# Altium footprint library Header.PcbLib: 297 footprints (part 19 of 23)
Each footprint in its own frame and in the unit in brackets; x right, y up, seen from the top. Pads: shape width x height; smd on the part's side, far side on the other; paste and mask are expansions set on the pad; w line width, h text height; cw(c..) or ccw(c..) is an arc to the next point about the centre after c.
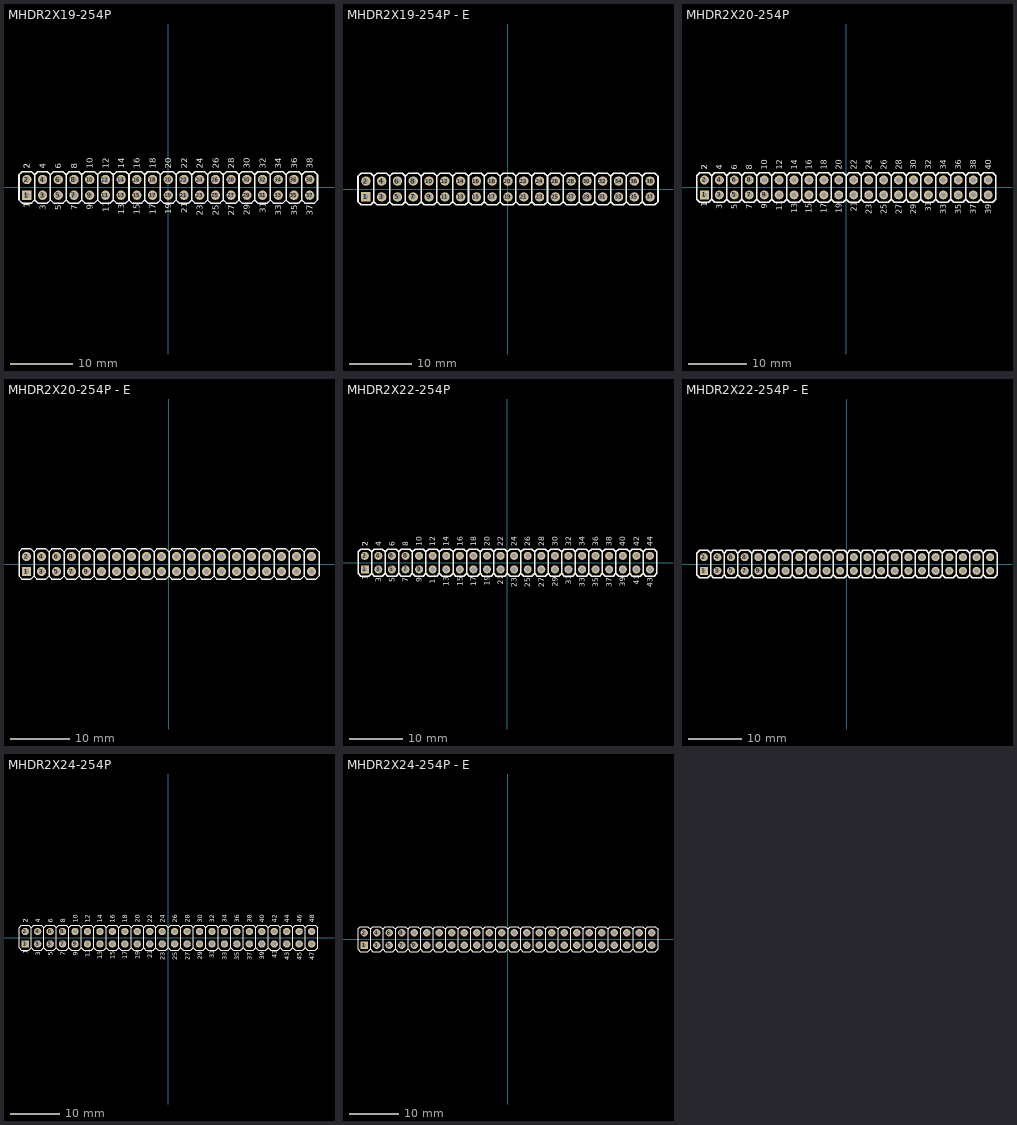
[diagram p18: the footprints below, top view; thin cyan lines are the x and y axes]

## MHDR2X19-254P [mm] "Male Header 2X19 with 2.54 mm Pitch"
pads (38):
  rect 1.5x1.5 hole 0.9: 1(-22.86,-1.27)
  round 1.5 hole 0.9: 2(-22.86,1.27) 3(-20.32,-1.27) 4(-20.32,1.27) 5(-17.78,-1.27) 6(-17.78,1.27) 7(-15.24,-1.27) 8(-15.24,1.27) 9(-12.7,-1.27) 10(-12.7,1.27) 11(-10.16,-1.27) 12(-10.16,1.27) 13(-7.62,-1.27) 14(-7.62,1.27) 15(-5.08,-1.27) 16(-5.08,1.27) 17(-2.54,-1.27) 18(-2.54,1.27) 19(0,-1.27) 20(0,1.27) 21(2.54,-1.27) 22(2.54,1.27) 23(5.08,-1.27) 24(5.08,1.27) 25(7.62,-1.27) 26(7.62,1.27) 27(10.16,-1.27) 28(10.16,1.27) 29(12.7,-1.27) 30(12.7,1.27) 31(15.24,-1.27) 32(15.24,1.27) 33(17.78,-1.27) 34(17.78,1.27) 35(20.32,-1.27) 36(20.32,1.27) 37(22.86,-1.27) 38(22.86,1.27)
Top Overlay:
  lines w0.254: -21.59,-2.032 -21.083,-2.538 -19.558,-2.538 -19.05,-2.03 -19.05,2.034 -18.542,2.542 -17.019,2.542 -16.51,2.032 ; -21.59,2.032 -22.099,2.542 -23.622,2.542 -24.13,2.034 -24.13,-2.032 -23.623,-2.538 -22.098,-2.538 -21.59,-2.03 -21.59,2.034 -21.082,2.542 -19.559,2.542 -19.05,2.032 ; -19.05,-2.032 -18.543,-2.538 -17.018,-2.538 -16.51,-2.03 -16.51,2.034 -16.002,2.542 -14.479,2.542 -13.97,2.032 ; -16.51,-2.032 -16.003,-2.538 -14.478,-2.538 -13.97,-2.03 -13.97,2.034 -13.462,2.542 -11.939,2.542 -11.43,2.032 ; -13.97,-2.032 -13.463,-2.538 -11.938,-2.538 -11.43,-2.03 -11.43,2.034 -10.922,2.542 -9.399,2.542 -8.89,2.032 ; -11.43,-2.032 -10.923,-2.538 -9.398,-2.538 -8.89,-2.03 -8.89,2.034 -8.382,2.542 -6.859,2.542 -6.35,2.032 ; -8.89,-2.032 -8.383,-2.538 -6.858,-2.538 -6.35,-2.03 -6.35,2.034 -5.842,2.542 -4.319,2.542 -3.81,2.032 ; -6.35,-2.032 -5.843,-2.538 -4.318,-2.538 -3.81,-2.03 -3.81,2.034 -3.302,2.542 -1.779,2.542 -1.27,2.032 ; -3.81,-2.032 -3.303,-2.538 -1.778,-2.538 -1.27,-2.03 -1.27,2.034 -0.762,2.542 0.761,2.542 1.27,2.032 ; -1.27,-2.032 -0.763,-2.538 0.762,-2.538 1.27,-2.03 1.27,2.034 1.778,2.542 3.301,2.542 3.81,2.032 ; 1.27,-2.032 1.777,-2.538 3.302,-2.538 3.81,-2.03 3.81,2.034 4.318,2.542 5.841,2.542 6.35,2.032 ; 3.81,-2.032 4.317,-2.538 5.842,-2.538 6.35,-2.03 6.35,2.034 6.858,2.542 8.381,2.542 8.89,2.032 ; 6.35,-2.032 6.857,-2.538 8.382,-2.538 8.89,-2.03 8.89,2.034 9.398,2.542 10.921,2.542 11.43,2.032 ; 8.89,-2.032 9.397,-2.538 10.922,-2.538 11.43,-2.03 11.43,2.034 11.938,2.542 13.461,2.542 13.97,2.032 ; 11.43,-2.032 11.937,-2.538 13.462,-2.538 13.97,-2.03 13.97,2.034 14.478,2.542 16.001,2.542 16.51,2.032 ; 13.97,-2.032 14.477,-2.538 16.002,-2.538 16.51,-2.03 16.51,2.034 17.018,2.542 18.541,2.542 19.05,2.032 ; 16.51,-2.032 17.017,-2.538 18.542,-2.538 19.05,-2.03 19.05,2.034 19.558,2.542 21.081,2.542 21.59,2.032 ; 19.05,-2.032 19.557,-2.538 21.082,-2.538 21.59,-2.03 21.59,2.034 22.098,2.542 23.621,2.542 24.13,2.032 ; 21.59,-2.032 22.097,-2.538 23.622,-2.538 24.13,-2.03 24.13,2.034
  text "1" at -22.352,-3.253 h1
  text "2" at -22.352,3.048 h1
  text "2" at -22.352,3.048 h1
  text "1" at -22.352,-3.253 h1
  text "4" at -19.812,3.048 h1
  text "3" at -19.812,-3.682 h1
  text "6" at -17.272,3.048 h1
  text "5" at -17.272,-3.682 h1
  text "8" at -14.732,3.048 h1
  text "7" at -14.732,-3.682 h1
  text "10" at -12.192,3.048 h1
  text "9" at -12.192,-3.634 h1
  text "12" at -9.652,3.048 h1
  text "11" at -9.652,-3.986 h1
  text "14" at -7.112,3.048 h1
  text "13" at -7.112,-4.415 h1
  text "16" at -4.572,3.048 h1
  text "15" at -4.572,-4.415 h1
  text "18" at -2.032,3.048 h1
  text "17" at -2.032,-4.415 h1
  text "20" at 0.508,3.048 h1
  text "19" at 0.508,-4.367 h1
  text "22" at 3.048,3.048 h1
  text "21" at 3.048,-4.144 h1
  text "24" at 5.588,3.048 h1
  text "23" at 5.588,-4.572 h1
  text "26" at 8.128,3.048 h1
  text "25" at 8.128,-4.572 h1
  text "28" at 10.668,3.048 h1
  text "27" at 10.668,-4.572 h1
  text "30" at 13.208,3.048 h1
  text "29" at 13.208,-4.524 h1
  text "32" at 15.748,3.048 h1
  text "31" at 15.748,-4.144 h1
  text "34" at 18.288,3.048 h1
  text "33" at 18.288,-4.572 h1
  text "36" at 20.828,3.048 h1
  text "35" at 20.828,-4.572 h1
  text "38" at 23.368,3.048 h1
  text "37" at 23.368,-4.572 h1
3D body "PIN.STEP": height 8.43, standoff -2.49, extent 21.59,0 24.13,2.54
3D body "PIN.STEP": height 8.43, standoff -2.49, extent 21.59,-2.54 24.13,0
3D body "PIN.STEP": height 8.43, standoff -2.49, extent -24.13,-2.54 -21.59,0
3D body "PIN_mid.STEP": height 8.43, standoff -2.49, extent -19.05,0 -16.51,2.54
3D body "PIN_mid.STEP": height 8.43, standoff -2.49, extent -16.51,0 -13.97,2.54
3D body "PIN_mid.STEP": height 8.43, standoff -2.49, extent -13.97,0 -11.43,2.54
3D body "PIN_mid.STEP": height 8.43, standoff -2.49, extent -11.43,0 -8.89,2.54
3D body "PIN_mid.STEP": height 8.43, standoff -2.49, extent -8.89,0 -6.35,2.54
3D body "PIN_mid.STEP": height 8.43, standoff -2.49, extent -6.35,0 -3.81,2.54
3D body "PIN_mid.STEP": height 8.43, standoff -2.49, extent -3.81,0 -1.27,2.54
3D body "PIN_mid.STEP": height 8.43, standoff -2.49, extent -1.27,0 1.27,2.54
3D body "PIN_mid.STEP": height 8.43, standoff -2.49, extent 1.27,0 3.81,2.54
3D body "PIN_mid.STEP": height 8.43, standoff -2.49, extent 3.81,0 6.35,2.54
3D body "PIN_mid.STEP": height 8.43, standoff -2.49, extent 6.35,0 8.89,2.54
3D body "PIN_mid.STEP": height 8.43, standoff -2.49, extent 8.89,0 11.43,2.54
3D body "PIN_mid.STEP": height 8.43, standoff -2.49, extent 11.43,0 13.97,2.54
3D body "PIN_mid.STEP": height 8.43, standoff -2.49, extent 13.97,0 16.51,2.54
3D body "PIN_mid.STEP": height 8.43, standoff -2.49, extent 16.51,0 19.05,2.54
3D body "PIN_mid.STEP": height 8.43, standoff -2.49, extent 19.05,0 21.59,2.54
3D body "PIN_mid.STEP": height 8.43, standoff -2.49, extent -21.59,0 -19.05,2.54
3D body "PIN_mid.STEP": height 8.43, standoff -2.49, extent -21.59,-2.54 -19.05,0
3D body "PIN_mid.STEP": height 8.43, standoff -2.49, extent -19.05,-2.54 -16.51,0
3D body "PIN_mid.STEP": height 8.43, standoff -2.49, extent -16.51,-2.54 -13.97,0
3D body "PIN_mid.STEP": height 8.43, standoff -2.49, extent -13.97,-2.54 -11.43,0
3D body "PIN_mid.STEP": height 8.43, standoff -2.49, extent -11.43,-2.54 -8.89,0
3D body "PIN_mid.STEP": height 8.43, standoff -2.49, extent -8.89,-2.54 -6.35,0
3D body "PIN_mid.STEP": height 8.43, standoff -2.49, extent -6.35,-2.54 -3.81,0
3D body "PIN_mid.STEP": height 8.43, standoff -2.49, extent -3.81,-2.54 -1.27,0
3D body "PIN_mid.STEP": height 8.43, standoff -2.49, extent -1.27,-2.54 1.27,0
3D body "PIN_mid.STEP": height 8.43, standoff -2.49, extent 1.27,-2.54 3.81,0
3D body "PIN_mid.STEP": height 8.43, standoff -2.49, extent 3.81,-2.54 6.35,0
3D body "PIN_mid.STEP": height 8.43, standoff -2.49, extent 6.35,-2.54 8.89,0
3D body "PIN_mid.STEP": height 8.43, standoff -2.49, extent 8.89,-2.54 11.43,0
3D body "PIN_mid.STEP": height 8.43, standoff -2.49, extent 11.43,-2.54 13.97,0
3D body "PIN_mid.STEP": height 8.43, standoff -2.49, extent 13.97,-2.54 16.51,0
3D body "PIN_mid.STEP": height 8.43, standoff -2.49, extent 16.51,-2.54 19.05,0
3D body "PIN_mid.STEP": height 8.43, standoff -2.49, extent 19.05,-2.54 21.59,0
3D body "PIN.STEP": height 8.43, standoff -2.49, extent -24.13,0 -21.59,2.54

## MHDR2X19-254P - E [mm] "Male Header 2X19 with 2.54 mm Pitch"
pads (38):
  rect 1.5x1.5 hole 0.9: 1(-22.86,-1.27)
  round 1.5 hole 0.9: 2(-22.86,1.27) 3(-20.32,-1.27) 4(-20.32,1.27) 5(-17.78,-1.27) 6(-17.78,1.27) 7(-15.24,-1.27) 8(-15.24,1.27) 9(-12.7,-1.27) 10(-12.7,1.27) 11(-10.16,-1.27) 12(-10.16,1.27) 13(-7.62,-1.27) 14(-7.62,1.27) 15(-5.08,-1.27) 16(-5.08,1.27) 17(-2.54,-1.27) 18(-2.54,1.27) 19(0,-1.27) 20(0,1.27) 21(2.54,-1.27) 22(2.54,1.27) 23(5.08,-1.27) 24(5.08,1.27) 25(7.62,-1.27) 26(7.62,1.27) 27(10.16,-1.27) 28(10.16,1.27) 29(12.7,-1.27) 30(12.7,1.27) 31(15.24,-1.27) 32(15.24,1.27) 33(17.78,-1.27) 34(17.78,1.27) 35(20.32,-1.27) 36(20.32,1.27) 37(22.86,-1.27) 38(22.86,1.27)
Top Overlay:
  lines w0.254: -21.59,-2.032 -21.083,-2.538 -19.558,-2.538 -19.05,-2.03 -19.05,2.034 -18.542,2.542 -17.019,2.542 -16.51,2.032 ; -21.59,2.032 -22.099,2.542 -23.622,2.542 -24.13,2.034 -24.13,-2.032 -23.623,-2.538 -22.098,-2.538 -21.59,-2.03 -21.59,2.034 -21.082,2.542 -19.559,2.542 -19.05,2.032 ; -19.05,-2.032 -18.543,-2.538 -17.018,-2.538 -16.51,-2.03 -16.51,2.034 -16.002,2.542 -14.479,2.542 -13.97,2.032 ; -16.51,-2.032 -16.003,-2.538 -14.478,-2.538 -13.97,-2.03 -13.97,2.034 -13.462,2.542 -11.939,2.542 -11.43,2.032 ; -13.97,-2.032 -13.463,-2.538 -11.938,-2.538 -11.43,-2.03 -11.43,2.034 -10.922,2.542 -9.399,2.542 -8.89,2.032 ; -11.43,-2.032 -10.923,-2.538 -9.398,-2.538 -8.89,-2.03 -8.89,2.034 -8.382,2.542 -6.859,2.542 -6.35,2.032 ; -8.89,-2.032 -8.383,-2.538 -6.858,-2.538 -6.35,-2.03 -6.35,2.034 -5.842,2.542 -4.319,2.542 -3.81,2.032 ; -6.35,-2.032 -5.843,-2.538 -4.318,-2.538 -3.81,-2.03 -3.81,2.034 -3.302,2.542 -1.779,2.542 -1.27,2.032 ; -3.81,-2.032 -3.303,-2.538 -1.778,-2.538 -1.27,-2.03 -1.27,2.034 -0.762,2.542 0.761,2.542 1.27,2.032 ; -1.27,-2.032 -0.763,-2.538 0.762,-2.538 1.27,-2.03 1.27,2.034 1.778,2.542 3.301,2.542 3.81,2.032 ; 1.27,-2.032 1.777,-2.538 3.302,-2.538 3.81,-2.03 3.81,2.034 4.318,2.542 5.841,2.542 6.35,2.032 ; 3.81,-2.032 4.317,-2.538 5.842,-2.538 6.35,-2.03 6.35,2.034 6.858,2.542 8.381,2.542 8.89,2.032 ; 6.35,-2.032 6.857,-2.538 8.382,-2.538 8.89,-2.03 8.89,2.034 9.398,2.542 10.921,2.542 11.43,2.032 ; 8.89,-2.032 9.397,-2.538 10.922,-2.538 11.43,-2.03 11.43,2.034 11.938,2.542 13.461,2.542 13.97,2.032 ; 11.43,-2.032 11.937,-2.538 13.462,-2.538 13.97,-2.03 13.97,2.034 14.478,2.542 16.001,2.542 16.51,2.032 ; 13.97,-2.032 14.477,-2.538 16.002,-2.538 16.51,-2.03 16.51,2.034 17.018,2.542 18.541,2.542 19.05,2.032 ; 16.51,-2.032 17.017,-2.538 18.542,-2.538 19.05,-2.03 19.05,2.034 19.558,2.542 21.081,2.542 21.59,2.032 ; 19.05,-2.032 19.557,-2.538 21.082,-2.538 21.59,-2.03 21.59,2.034 22.098,2.542 23.621,2.542 24.13,2.032 ; 21.59,-2.032 22.097,-2.538 23.622,-2.538 24.13,-2.03 24.13,2.034
3D body "PIN_mid.STEP": height 8.43, standoff -2.49, extent -19.05,0 -16.51,2.54
3D body "PIN_mid.STEP": height 8.43, standoff -2.49, extent -16.51,0 -13.97,2.54
3D body "PIN_mid.STEP": height 8.43, standoff -2.49, extent -13.97,0 -11.43,2.54
3D body "PIN_mid.STEP": height 8.43, standoff -2.49, extent -11.43,0 -8.89,2.54
3D body "PIN_mid.STEP": height 8.43, standoff -2.49, extent -8.89,0 -6.35,2.54
3D body "PIN_mid.STEP": height 8.43, standoff -2.49, extent -6.35,0 -3.81,2.54
3D body "PIN_mid.STEP": height 8.43, standoff -2.49, extent -3.81,0 -1.27,2.54
3D body "PIN_mid.STEP": height 8.43, standoff -2.49, extent -1.27,0 1.27,2.54
3D body "PIN_mid.STEP": height 8.43, standoff -2.49, extent 1.27,0 3.81,2.54
3D body "PIN_mid.STEP": height 8.43, standoff -2.49, extent 3.81,0 6.35,2.54
3D body "PIN_mid.STEP": height 8.43, standoff -2.49, extent 6.35,0 8.89,2.54
3D body "PIN_mid.STEP": height 8.43, standoff -2.49, extent 8.89,0 11.43,2.54
3D body "PIN_mid.STEP": height 8.43, standoff -2.49, extent 11.43,0 13.97,2.54
3D body "PIN_mid.STEP": height 8.43, standoff -2.49, extent 13.97,0 16.51,2.54
3D body "PIN_mid.STEP": height 8.43, standoff -2.49, extent 16.51,0 19.05,2.54
3D body "PIN_mid.STEP": height 8.43, standoff -2.49, extent 19.05,0 21.59,2.54
3D body "PIN_mid.STEP": height 8.43, standoff -2.49, extent -21.59,0 -19.05,2.54
3D body "PIN_mid.STEP": height 8.43, standoff -2.49, extent -21.59,-2.54 -19.05,0
3D body "PIN_mid.STEP": height 8.43, standoff -2.49, extent -19.05,-2.54 -16.51,0
3D body "PIN_mid.STEP": height 8.43, standoff -2.49, extent -16.51,-2.54 -13.97,0
3D body "PIN_mid.STEP": height 8.43, standoff -2.49, extent -13.97,-2.54 -11.43,0
3D body "PIN_mid.STEP": height 8.43, standoff -2.49, extent -11.43,-2.54 -8.89,0
3D body "PIN_mid.STEP": height 8.43, standoff -2.49, extent -8.89,-2.54 -6.35,0
3D body "PIN_mid.STEP": height 8.43, standoff -2.49, extent -6.35,-2.54 -3.81,0
3D body "PIN_mid.STEP": height 8.43, standoff -2.49, extent -3.81,-2.54 -1.27,0
3D body "PIN_mid.STEP": height 8.43, standoff -2.49, extent -1.27,-2.54 1.27,0
3D body "PIN_mid.STEP": height 8.43, standoff -2.49, extent 1.27,-2.54 3.81,0
3D body "PIN_mid.STEP": height 8.43, standoff -2.49, extent 3.81,-2.54 6.35,0
3D body "PIN_mid.STEP": height 8.43, standoff -2.49, extent 6.35,-2.54 8.89,0
3D body "PIN_mid.STEP": height 8.43, standoff -2.49, extent 8.89,-2.54 11.43,0
3D body "PIN_mid.STEP": height 8.43, standoff -2.49, extent 11.43,-2.54 13.97,0
3D body "PIN_mid.STEP": height 8.43, standoff -2.49, extent 13.97,-2.54 16.51,0
3D body "PIN_mid.STEP": height 8.43, standoff -2.49, extent 16.51,-2.54 19.05,0
3D body "PIN_mid.STEP": height 8.43, standoff -2.49, extent 19.05,-2.54 21.59,0
3D body "PIN.STEP": height 8.43, standoff -2.49, extent -24.13,0 -21.59,2.54
3D body "PIN.STEP": height 8.43, standoff -2.49, extent 21.59,0 24.13,2.54
3D body "PIN.STEP": height 8.43, standoff -2.49, extent 21.59,-2.54 24.13,0
3D body "PIN.STEP": height 8.43, standoff -2.49, extent -24.13,-2.54 -21.59,0

## MHDR2X20-254P [mm] "Male Header 2X20 with 2.54 mm Pitch"
pads (40):
  rect 1.5x1.5 hole 0.9: 1(-24.13,-1.27)
  round 1.5 hole 0.9: 2(-24.13,1.27) 3(-21.59,-1.27) 4(-21.59,1.27) 5(-19.05,-1.27) 6(-19.05,1.27) 7(-16.51,-1.27) 8(-16.51,1.27) 9(-13.97,-1.27) 10(-13.97,1.27) 11(-11.43,-1.27) 12(-11.43,1.27) 13(-8.89,-1.27) 14(-8.89,1.27) 15(-6.35,-1.27) 16(-6.35,1.27) 17(-3.81,-1.27) 18(-3.81,1.27) 19(-1.27,-1.27) 20(-1.27,1.27) 21(1.27,-1.27) 22(1.27,1.27) 23(3.81,-1.27) 24(3.81,1.27) 25(6.35,-1.27) 26(6.35,1.27) 27(8.89,-1.27) 28(8.89,1.27) 29(11.43,-1.27) 30(11.43,1.27) 31(13.97,-1.27) 32(13.97,1.27) 33(16.51,-1.27) 34(16.51,1.27) 35(19.05,-1.27) 36(19.05,1.27) 37(21.59,-1.27) 38(21.59,1.27) 39(24.13,-1.27) 40(24.13,1.27)
Top Overlay:
  lines w0.254: -22.86,-2.032 -22.353,-2.538 -20.828,-2.538 -20.32,-2.03 -20.32,2.034 -19.812,2.542 -18.289,2.542 -17.78,2.032 ; -22.86,2.032 -23.369,2.542 -24.892,2.542 -25.4,2.034 -25.4,-2.032 -24.893,-2.538 -23.368,-2.538 -22.86,-2.03 -22.86,2.034 -22.352,2.542 -20.829,2.542 -20.32,2.032 ; -20.32,-2.032 -19.813,-2.538 -18.288,-2.538 -17.78,-2.03 -17.78,2.034 -17.272,2.542 -15.749,2.542 -15.24,2.032 ; -17.78,-2.032 -17.273,-2.538 -15.748,-2.538 -15.24,-2.03 -15.24,2.034 -14.732,2.542 -13.209,2.542 -12.7,2.032 ; -15.24,-2.032 -14.733,-2.538 -13.208,-2.538 -12.7,-2.03 -12.7,2.034 -12.192,2.542 -10.669,2.542 -10.16,2.032 ; -12.7,-2.032 -12.193,-2.538 -10.668,-2.538 -10.16,-2.03 -10.16,2.034 -9.652,2.542 -8.129,2.542 -7.62,2.032 ; -10.16,-2.032 -9.653,-2.538 -8.128,-2.538 -7.62,-2.03 -7.62,2.034 -7.112,2.542 -5.589,2.542 -5.08,2.032 ; -7.62,-2.032 -7.113,-2.538 -5.588,-2.538 -5.08,-2.03 -5.08,2.034 -4.572,2.542 -3.049,2.542 -2.54,2.032 ; -5.08,-2.032 -4.573,-2.538 -3.048,-2.538 -2.54,-2.03 -2.54,2.034 -2.032,2.542 -0.509,2.542 0,2.032 ; -2.54,-2.032 -2.033,-2.538 -0.508,-2.538 0,-2.03 0,2.034 0.508,2.542 2.031,2.542 2.54,2.032 ; 0,-2.032 0.507,-2.538 2.032,-2.538 2.54,-2.03 2.54,2.034 3.048,2.542 4.571,2.542 5.08,2.032 ; 2.54,-2.032 3.047,-2.538 4.572,-2.538 5.08,-2.03 5.08,2.034 5.588,2.542 7.111,2.542 7.62,2.032 ; 5.08,-2.032 5.587,-2.538 7.112,-2.538 7.62,-2.03 7.62,2.034 8.128,2.542 9.651,2.542 10.16,2.032 ; 7.62,-2.032 8.127,-2.538 9.652,-2.538 10.16,-2.03 10.16,2.034 10.668,2.542 12.191,2.542 12.7,2.032 ; 10.16,-2.032 10.667,-2.538 12.192,-2.538 12.7,-2.03 12.7,2.034 13.208,2.542 14.731,2.542 15.24,2.032 ; 12.7,-2.032 13.207,-2.538 14.732,-2.538 15.24,-2.03 15.24,2.034 15.748,2.542 17.271,2.542 17.78,2.032 ; 15.24,-2.032 15.747,-2.538 17.272,-2.538 17.78,-2.03 17.78,2.034 18.288,2.542 19.811,2.542 20.32,2.032 ; 17.78,-2.032 18.287,-2.538 19.812,-2.538 20.32,-2.03 20.32,2.034 20.828,2.542 22.351,2.542 22.86,2.032 ; 20.32,-2.032 20.827,-2.538 22.352,-2.538 22.86,-2.03 22.86,2.034 23.368,2.542 24.891,2.542 25.4,2.032 ; 22.86,-2.032 23.367,-2.538 24.892,-2.538 25.4,-2.03 25.4,2.034
  text "1" at -23.622,-3.253 h1
  text "2" at -23.622,3.048 h1
  text "2" at -23.622,3.048 h1
  text "1" at -23.622,-3.253 h1
  text "4" at -21.082,3.048 h1
  text "3" at -21.082,-3.682 h1
  text "6" at -18.542,3.048 h1
  text "5" at -18.542,-3.682 h1
  text "8" at -16.002,3.048 h1
  text "7" at -16.002,-3.682 h1
  text "10" at -13.462,3.048 h1
  text "9" at -13.462,-3.634 h1
  text "12" at -10.922,3.048 h1
  text "11" at -10.922,-3.986 h1
  text "14" at -8.382,3.048 h1
  text "13" at -8.382,-4.415 h1
  text "16" at -5.842,3.048 h1
  text "15" at -5.842,-4.415 h1
  text "18" at -3.302,3.048 h1
  text "17" at -3.302,-4.415 h1
  text "20" at -0.762,3.048 h1
  text "19" at -0.762,-4.367 h1
  text "22" at 1.778,3.048 h1
  text "21" at 1.778,-4.144 h1
  text "24" at 4.318,3.048 h1
  text "23" at 4.318,-4.572 h1
  text "26" at 6.858,3.048 h1
  text "25" at 6.858,-4.572 h1
  text "28" at 9.398,3.048 h1
  text "27" at 9.398,-4.572 h1
  text "30" at 11.938,3.048 h1
  text "29" at 11.938,-4.524 h1
  text "32" at 14.478,3.048 h1
  text "31" at 14.478,-4.144 h1
  text "34" at 17.018,3.048 h1
  text "33" at 17.018,-4.572 h1
  text "36" at 19.558,3.048 h1
  text "35" at 19.558,-4.572 h1
  text "38" at 22.098,3.048 h1
  text "37" at 22.098,-4.572 h1
  text "40" at 24.638,3.048 h1
  text "39" at 24.638,-4.524 h1
3D body "PIN_mid.STEP": height 8.43, standoff -2.49, extent 10.16,0 12.7,2.54
3D body "PIN_mid.STEP": height 8.43, standoff -2.49, extent 12.7,0 15.24,2.54
3D body "PIN_mid.STEP": height 8.43, standoff -2.49, extent 15.24,0 17.78,2.54
3D body "PIN_mid.STEP": height 8.43, standoff -2.49, extent 17.78,0 20.32,2.54
3D body "PIN_mid.STEP": height 8.43, standoff -2.49, extent 20.32,0 22.86,2.54
3D body "PIN_mid.STEP": height 8.43, standoff -2.49, extent -22.86,0 -20.32,2.54
3D body "PIN_mid.STEP": height 8.43, standoff -2.49, extent -22.86,-2.54 -20.32,0
3D body "PIN_mid.STEP": height 8.43, standoff -2.49, extent -20.32,-2.54 -17.78,0
3D body "PIN_mid.STEP": height 8.43, standoff -2.49, extent -17.78,-2.54 -15.24,0
3D body "PIN_mid.STEP": height 8.43, standoff -2.49, extent -15.24,-2.54 -12.7,0
3D body "PIN_mid.STEP": height 8.43, standoff -2.49, extent -12.7,-2.54 -10.16,0
3D body "PIN_mid.STEP": height 8.43, standoff -2.49, extent -10.16,-2.54 -7.62,0
3D body "PIN_mid.STEP": height 8.43, standoff -2.49, extent -7.62,-2.54 -5.08,0
3D body "PIN_mid.STEP": height 8.43, standoff -2.49, extent -5.08,-2.54 -2.54,0
3D body "PIN_mid.STEP": height 8.43, standoff -2.49, extent -2.54,-2.54 0,0
3D body "PIN_mid.STEP": height 8.43, standoff -2.49, extent 0,-2.54 2.54,0
3D body "PIN_mid.STEP": height 8.43, standoff -2.49, extent 2.54,-2.54 5.08,0
3D body "PIN_mid.STEP": height 8.43, standoff -2.49, extent 5.08,-2.54 7.62,0
3D body "PIN_mid.STEP": height 8.43, standoff -2.49, extent 7.62,-2.54 10.16,0
3D body "PIN_mid.STEP": height 8.43, standoff -2.49, extent 10.16,-2.54 12.7,0
3D body "PIN_mid.STEP": height 8.43, standoff -2.49, extent 12.7,-2.54 15.24,0
3D body "PIN_mid.STEP": height 8.43, standoff -2.49, extent 15.24,-2.54 17.78,0
3D body "PIN_mid.STEP": height 8.43, standoff -2.49, extent 17.78,-2.54 20.32,0
3D body "PIN_mid.STEP": height 8.43, standoff -2.49, extent 20.32,-2.54 22.86,0
3D body "PIN.STEP": height 8.43, standoff -2.49, extent -25.4,0 -22.86,2.54
3D body "PIN.STEP": height 8.43, standoff -2.49, extent 22.86,0 25.4,2.54
3D body "PIN.STEP": height 8.43, standoff -2.49, extent 22.86,-2.54 25.4,0
3D body "PIN.STEP": height 8.43, standoff -2.49, extent -25.4,-2.54 -22.86,0
3D body "PIN_mid.STEP": height 8.43, standoff -2.49, extent -20.32,0 -17.78,2.54
3D body "PIN_mid.STEP": height 8.43, standoff -2.49, extent -17.78,0 -15.24,2.54
3D body "PIN_mid.STEP": height 8.43, standoff -2.49, extent -15.24,0 -12.7,2.54
3D body "PIN_mid.STEP": height 8.43, standoff -2.49, extent -12.7,0 -10.16,2.54
3D body "PIN_mid.STEP": height 8.43, standoff -2.49, extent -10.16,0 -7.62,2.54
3D body "PIN_mid.STEP": height 8.43, standoff -2.49, extent -7.62,0 -5.08,2.54
3D body "PIN_mid.STEP": height 8.43, standoff -2.49, extent -5.08,0 -2.54,2.54
3D body "PIN_mid.STEP": height 8.43, standoff -2.49, extent -2.54,0 0,2.54
3D body "PIN_mid.STEP": height 8.43, standoff -2.49, extent 0,0 2.54,2.54
3D body "PIN_mid.STEP": height 8.43, standoff -2.49, extent 2.54,0 5.08,2.54
3D body "PIN_mid.STEP": height 8.43, standoff -2.49, extent 5.08,0 7.62,2.54
3D body "PIN_mid.STEP": height 8.43, standoff -2.49, extent 7.62,0 10.16,2.54

## MHDR2X20-254P - E [mm] "Male Header 2X20 with 2.54 mm Pitch"
pads (40):
  rect 1.5x1.5 hole 0.9: 1(-24.13,-1.27)
  round 1.5 hole 0.9: 2(-24.13,1.27) 3(-21.59,-1.27) 4(-21.59,1.27) 5(-19.05,-1.27) 6(-19.05,1.27) 7(-16.51,-1.27) 8(-16.51,1.27) 9(-13.97,-1.27) 10(-13.97,1.27) 11(-11.43,-1.27) 12(-11.43,1.27) 13(-8.89,-1.27) 14(-8.89,1.27) 15(-6.35,-1.27) 16(-6.35,1.27) 17(-3.81,-1.27) 18(-3.81,1.27) 19(-1.27,-1.27) 20(-1.27,1.27) 21(1.27,-1.27) 22(1.27,1.27) 23(3.81,-1.27) 24(3.81,1.27) 25(6.35,-1.27) 26(6.35,1.27) 27(8.89,-1.27) 28(8.89,1.27) 29(11.43,-1.27) 30(11.43,1.27) 31(13.97,-1.27) 32(13.97,1.27) 33(16.51,-1.27) 34(16.51,1.27) 35(19.05,-1.27) 36(19.05,1.27) 37(21.59,-1.27) 38(21.59,1.27) 39(24.13,-1.27) 40(24.13,1.27)
Top Overlay:
  lines w0.254: -22.86,-2.032 -22.353,-2.538 -20.828,-2.538 -20.32,-2.03 -20.32,2.034 -19.812,2.542 -18.289,2.542 -17.78,2.032 ; -22.86,2.032 -23.369,2.542 -24.892,2.542 -25.4,2.034 -25.4,-2.032 -24.893,-2.538 -23.368,-2.538 -22.86,-2.03 -22.86,2.034 -22.352,2.542 -20.829,2.542 -20.32,2.032 ; -20.32,-2.032 -19.813,-2.538 -18.288,-2.538 -17.78,-2.03 -17.78,2.034 -17.272,2.542 -15.749,2.542 -15.24,2.032 ; -17.78,-2.032 -17.273,-2.538 -15.748,-2.538 -15.24,-2.03 -15.24,2.034 -14.732,2.542 -13.209,2.542 -12.7,2.032 ; -15.24,-2.032 -14.733,-2.538 -13.208,-2.538 -12.7,-2.03 -12.7,2.034 -12.192,2.542 -10.669,2.542 -10.16,2.032 ; -12.7,-2.032 -12.193,-2.538 -10.668,-2.538 -10.16,-2.03 -10.16,2.034 -9.652,2.542 -8.129,2.542 -7.62,2.032 ; -10.16,-2.032 -9.653,-2.538 -8.128,-2.538 -7.62,-2.03 -7.62,2.034 -7.112,2.542 -5.589,2.542 -5.08,2.032 ; -7.62,-2.032 -7.113,-2.538 -5.588,-2.538 -5.08,-2.03 -5.08,2.034 -4.572,2.542 -3.049,2.542 -2.54,2.032 ; -5.08,-2.032 -4.573,-2.538 -3.048,-2.538 -2.54,-2.03 -2.54,2.034 -2.032,2.542 -0.509,2.542 0,2.032 ; -2.54,-2.032 -2.033,-2.538 -0.508,-2.538 0,-2.03 0,2.034 0.508,2.542 2.031,2.542 2.54,2.032 ; 0,-2.032 0.507,-2.538 2.032,-2.538 2.54,-2.03 2.54,2.034 3.048,2.542 4.571,2.542 5.08,2.032 ; 2.54,-2.032 3.047,-2.538 4.572,-2.538 5.08,-2.03 5.08,2.034 5.588,2.542 7.111,2.542 7.62,2.032 ; 5.08,-2.032 5.587,-2.538 7.112,-2.538 7.62,-2.03 7.62,2.034 8.128,2.542 9.651,2.542 10.16,2.032 ; 7.62,-2.032 8.127,-2.538 9.652,-2.538 10.16,-2.03 10.16,2.034 10.668,2.542 12.191,2.542 12.7,2.032 ; 10.16,-2.032 10.667,-2.538 12.192,-2.538 12.7,-2.03 12.7,2.034 13.208,2.542 14.731,2.542 15.24,2.032 ; 12.7,-2.032 13.207,-2.538 14.732,-2.538 15.24,-2.03 15.24,2.034 15.748,2.542 17.271,2.542 17.78,2.032 ; 15.24,-2.032 15.747,-2.538 17.272,-2.538 17.78,-2.03 17.78,2.034 18.288,2.542 19.811,2.542 20.32,2.032 ; 17.78,-2.032 18.287,-2.538 19.812,-2.538 20.32,-2.03 20.32,2.034 20.828,2.542 22.351,2.542 22.86,2.032 ; 20.32,-2.032 20.827,-2.538 22.352,-2.538 22.86,-2.03 22.86,2.034 23.368,2.542 24.891,2.542 25.4,2.032 ; 22.86,-2.032 23.367,-2.538 24.892,-2.538 25.4,-2.03 25.4,2.034